# Altium integrated library ZJUDancer_Circuit_V3.6.3.IntLib: 32 symbols
Pins are listed as number, name and electrical type; pins without a type are passive.

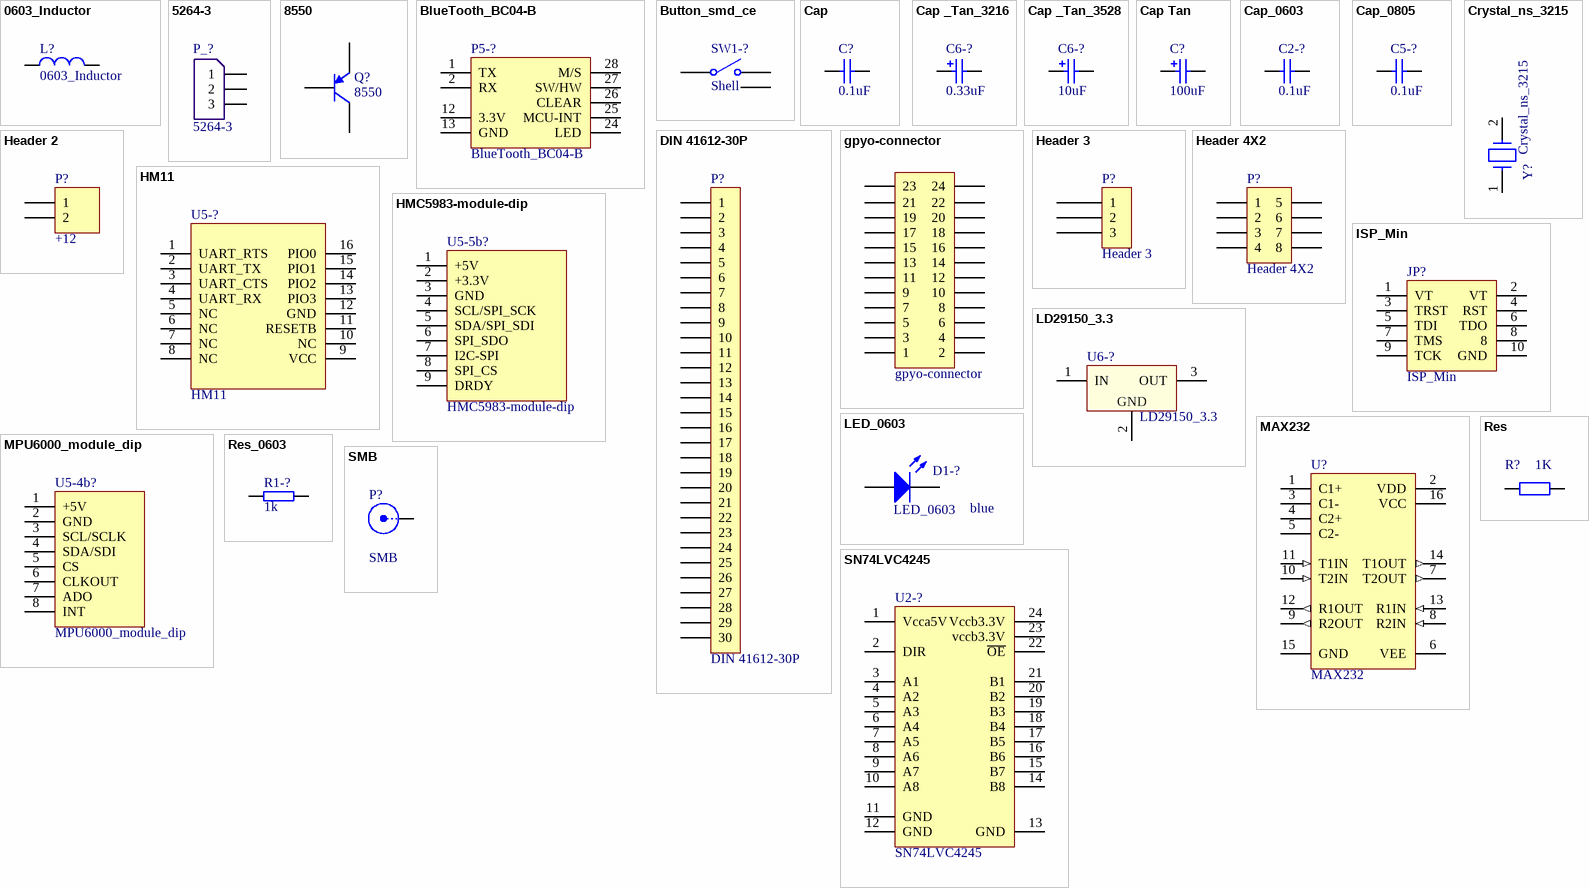
[diagram p0: symbols 0603_Inductor to SN74LVC4245]

## 0603_Inductor
designator L?
电感
footprint 0603_Inductor
pins: 1, 2

## 5264-3
designator P_?
footprint 5264-3 - wan
pins: 1, 2, 3

## 8550
designator Q?
PNP Bipolar Transistor,  SMD; Code - JEDEC: SOT-23; Published: 8-Jun-2000; Revision: July-2002: Re-released for DXP Platform.; Publisher: Altium Limited
footprint 8550_SOT23
pins: 1 B, 2 E, 3 C

## BlueTooth_BC04-B
designator P5-?
蓝牙模块BC04-B; LatestRevisionDate: 17-Jul-2002; LatestRevisionNote: Re-released for DXP Platform.; Publisher: Altium Limited
footprint BlueTooth_BC04-B
pins: 1 TX, 2 RX, 12 3.3V, 13 GND, 24 LED, 25 MCU-INT, 26 CLEAR, 27 SW/HW, 28 M/S

## Button_smd_ce
designator SW1-?  (value not drawn)
Published: 24-Mar-1999; LatestRevisionDate: 17-Jul-2002; LatestRevisionNote: Re-released for DXP Platform.; PackageReference: SPST-2; Publisher: Altium Limited; PackageDescription: Switch; 2 Leads
footprint Button_smd_ce
pins: 0 Shell, 1 COMMON, 2 NO

## Cap
designator C?, comment 0.1uF
Capacitor; Manufacturer: Generic Components; Class: Passive; Published: 08/06/2000; Publisher: Altium Hobart Technology Centre; SubClass: Capacitor; Value: 0.1uF
footprint 0805c
footprint 1206
pins: 1, 2

## Cap _Tan_3216
designator C6-?  value 0.33uF  (hidden comment: Cap _Tan_3216)
Tantalum Capacitor,  SMD; Manufacturer: Generic Components; Class: Passive; Published: 14/01/2012; Publisher: ZJUDancer; SubClass: Capacitor
footprint TCAP_3216A
footprint TCAP_3216A
pins: 1, 2

## Cap _Tan_3528
designator C6-?  value 10uF  (hidden comment: Cap _Tan_3528)
Tantalum Capacitor,  SMD; Manufacturer: Generic Components; Class: Passive; Published: 14/01/2012; Publisher: ZJUDancer; SubClass: Capacitor
footprint TCAP_3528A
footprint TCAP_3528A
pins: 1, 2

## Cap Tan
designator C?, comment 100uF
tantalum capacitor; value: 100uF
footprint TCap_7343D
pins: 1, 2

## Cap_0603
designator C2-?  value 0.1uF  (hidden comment: Cap_0603)
Manufacturer: Generic Components; Class: Passive; SubClass: Capacitor; Published: 08/06/2000; Publisher: Altium Hobart Technology Centre
footprint Cap_0603
footprint 1206
pins: 1, 2

## Cap_0805
designator C5-?  value 0.1uF  (hidden comment: Cap_0805)
Manufacturer: Generic Components; Class: Passive; SubClass: Capacitor; Published: 08/06/2000; Publisher: Altium Hobart Technology Centre
footprint 0805_Cap
footprint 1206
footprint 0805C
footprint Cap_0603
pins: 1, 2

## Crystal_ns_3215
designator Y?
无源晶振
footprint Crystal_ns_3215
pins: 1, 2
2 alternate drawings of the same symbol

## DIN 41612-30P
designator P?
footprint DIN 41612-30P/P
footprint DIN 41612-30P/R
pins: 1, 2, 3, 4, 5, 6, 7, 8, 9, 10, 11, 12, 13, 14, 15, 16, 17, 18, 19, 20, 21, 22, 23, 24, 25, 26, 27, 28, 29, 30

## gpyo-connector
designator ?
footprint gypo-connector
pins: 1, 2, 3, 4, 5, 6, 7, 8, 9, 10, 11, 12, 13, 14, 15, 16, 17, 18, 19, 20, 21, 22, 23, 24

## Header 2
designator P?, comment +12
Header, 2-Pin; Manufacturer: Generic Components; Class: Connector
footprint conector3.96_8L*8W_2*1_yellow
footprint conector3.96_7.92l*11.7w_2*1_white
footprint HEADER2.54_2
pins: 1, 2

## Header 3
designator P?
footprint HEADER2.0_3 (Footprint not found)
pins: 1, 2, 3

## Header 4X2
designator P?
footprint HEADER2.54_4*2
pins: 1, 2, 3, 4, 5, 6, 7, 8

## HM11
designator U5-?
Bluetooth Module; Manufacturer: Generic Components; Class: Active; SubClass: RS-232 Receptor&Deliver; Published: 14/01/2012; Publisher: ZJUDancer
footprint HM11
pins: 1 UART_RTS, 2 UART_TX, 3 UART_CTS, 4 UART_RX, 5 NC, 6 NC, 7 NC, 8 NC, 9 VCC, 10 NC, 11 RESETB, 12 GND, 13 PIO3, 14 PIO2, 15 PIO1, 16 PIO0

## HMC5983-module-dip
designator U5-5b?
LatestRevisionDate: 17-Jul-2002; LatestRevisionNote: Re-released for DXP Platform.; Publisher: Altium Limited
footprint HMC5983-module-dip (Connector; Header; 9 Position)
signal-integrity model Connector
pins: 1 +5V, 2 +3.3V, 3 GND, 4 SCL/SPI_SCK, 5 SDA/SPI_SDI, 6 SPI_SDO, 7 I2C-SPI, 8 SPI_CS, 9 DRDY

## ISP_Min
designator JP?
Header, 5-Pin, Dual row; LatestRevisionDate: 17-Jul-2002; LatestRevisionNote: Re-released for DXP Platform.; Publisher: Altium Limited
footprint ISP_Min
signal-integrity model Connector
pins: 1 VT, 2 VT, 3 TRST, 4 RST, 5 TDI, 6 TDO, 7 TMS, 8, 9 TCK, 10 GND

## LD29150_3.3
designator U6-?
footprint DPAK_LD29150-3.3
pins: 1 IN, 2, 3 OUT
text: GND

## LED_0603
designator D1-?  Color: blue
Published: 8-Jun-2000; LatestRevisionDate: 17-Jul-2002; LatestRevisionNote: Re-released for DXP Platform.; PackageDocument: Feb-2002; PackageReference: 3.2X1.6X1.1; Publisher: Altium Limited
footprint 0603_led
pins: 1 A, 2 K

## MAX232
designator U?
+5V Powered, Multi-Channel RS-232 Driver/Receiver; Manufacturer: Generic Components; Class: Active; SubClass: RS-232 Receptor&Deliver; Published: 14/01/2012; Publisher: ZJUDancer
footprint MAX232_SOIC16
pins: 1 C1+, 2 VDD (power), 3 C1-, 4 C2+, 5 C2-, 6 VEE, 7 T2OUT (out), 8 R2IN (in), 9 R2OUT (out), 10 T2IN (in), 11 T1IN (in), 12 R1OUT (out), 13 R1IN (in), 14 T1OUT (out), 15 GND (power), 16 VCC (power)

## MPU6000_module_dip
designator U5-4b?
LatestRevisionDate: 17-Jul-2002; LatestRevisionNote: Re-released for DXP Platform.; Publisher: Altium Limited
footprint MPU6000_module_dip (Connector; Header; 8 Position)
signal-integrity model Connector
pins: 1 +5V, 2 GND, 3 SCL/SCLK, 4 SDA/SDI, 5 CS, 6 CLKOUT, 7 ADO, 8 INT

## Res
designator R?, comment value 1K  (hidden comment: 4.7k)
Resistor; Published: 8-Jun-2000; LatestRevisionDate: 17-Jul-2002; LatestRevisionNote: Re-released for DXP Platform.; Publisher: Altium Limited
footprint 0805R
footprint 1206
pins: 1, 2

## Res_0603
designator R1-?, comment value 1k  (hidden comment: Res)
Resistor; Published: 8-Jun-2000; LatestRevisionDate: 17-Jul-2002; LatestRevisionNote: Re-released for DXP Platform.; PackageReference: 0805; Publisher: Altium Limited
footprint 0805_Res
simulation model RESISTOR (Resistor)
signal-integrity model Res
footprint 0805R
footprint 0603_Res
pins: 1, 2

## SMB
designator P?
SMB Straight Connector; LatestRevisionDate: 17-Jul-2002; LatestRevisionNote: Re-released for DXP Platform.; Publisher: Altium Limited
footprint 安装孔
signal-integrity model Connector
footprint 小安装孔
pins: 1 X

## SN74LVC4245
designator U2-?
3.3V-5V电平转换
footprint SN74LVC4245_SOP24_Small
pins: 1 Vcca5V, 2 DIR, 3 A1, 4 A2, 5 A3, 6 A4, 7 A5, 8 A6, 9 A7, 10 A8, 11 GND, 12 GND, 13 GND, 14 B8, 15 B7, 16 B6, 17 B5, 18 B4, 19 B3, 20 B2, 21 B1, 22 ~{OE}, 23 vccb3.3V, 24 Vccb3.3V

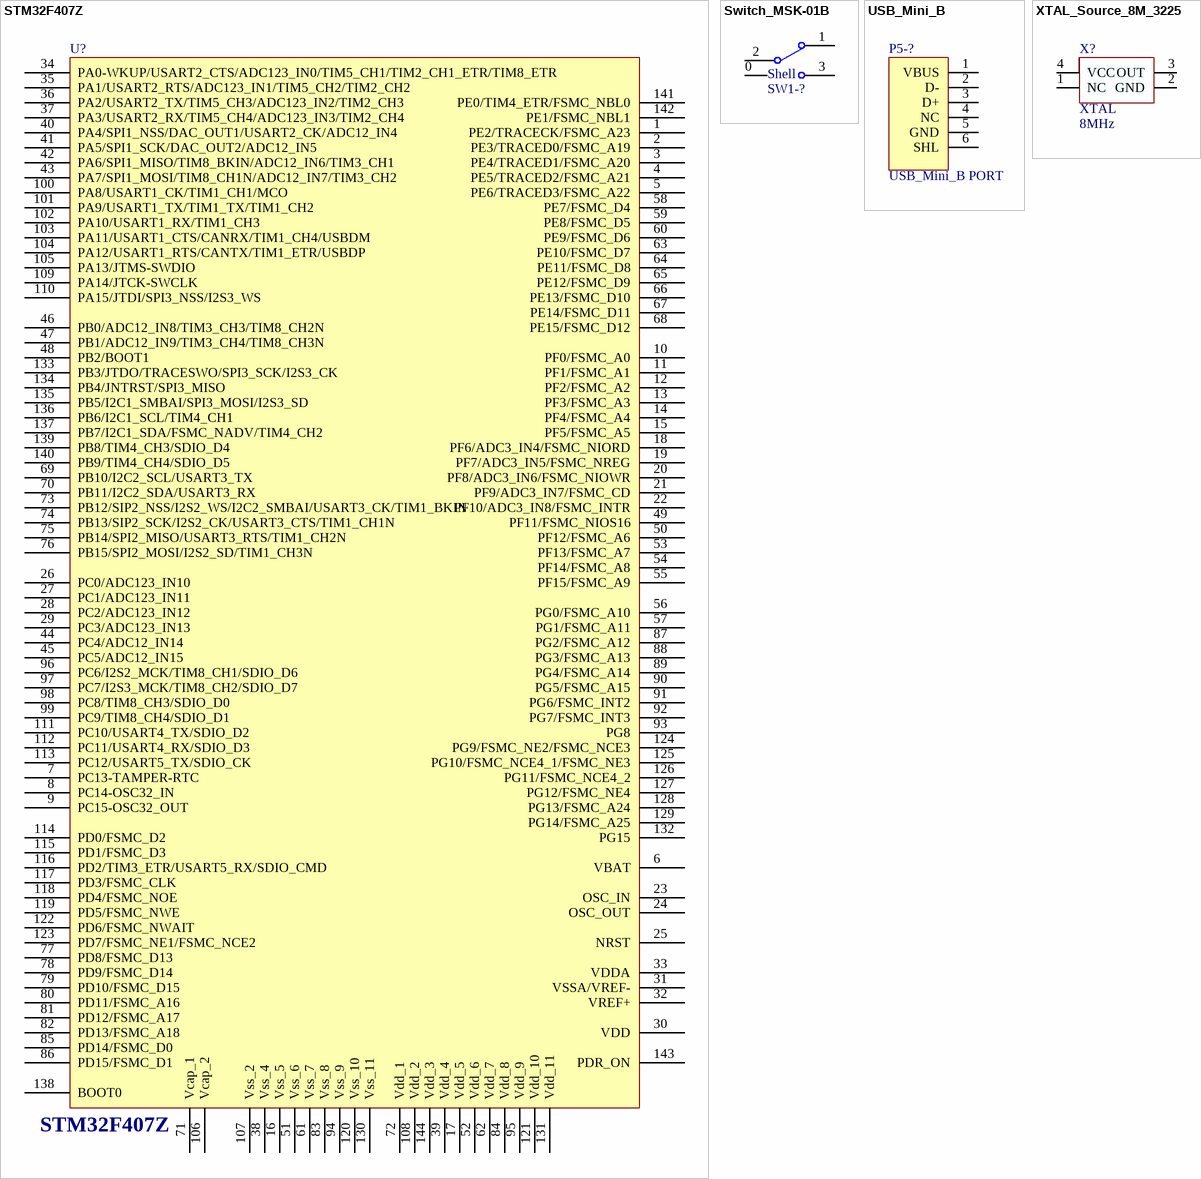
[diagram p1: symbols STM32F407Z to XTAL_Source_8M_3225]

## STM32F407Z
designator U?
ARM-Cortex-M4-Microcontroller
footprint STM32F407_LQFP144
pins: 1 PE2/TRACECK/FSMC_A23, 2 PE3/TRACED0/FSMC_A19, 3 PE4/TRACED1/FSMC_A20, 4 PE5/TRACED2/FSMC_A21, 5 PE6/TRACED3/FSMC_A22, 6 VBAT, 7 PC13-TAMPER-RTC, 8 PC14-OSC32_IN, 9 PC15-OSC32_OUT, 10 PF0/FSMC_A0, 11 PF1/FSMC_A1, 12 PF2/FSMC_A2, 13 PF3/FSMC_A3, 14 PF4/FSMC_A4, 15 PF5/FSMC_A5, 16 Vss_5, 17 Vdd_5, 18 PF6/ADC3_IN4/FSMC_NIORD, 19 PF7/ADC3_IN5/FSMC_NREG, 20 PF8/ADC3_IN6/FSMC_NIOWR, 21 PF9/ADC3_IN7/FSMC_CD, 22 PF10/ADC3_IN8/FSMC_INTR, 23 OSC_IN, 24 OSC_OUT, 25 NRST, 26 PC0/ADC123_IN10, 27 PC1/ADC123_IN11, 28 PC2/ADC123_IN12, 29 PC3/ADC123_IN13, 30 VDD, 31 VSSA/VREF-, 32 VREF+, 33 VDDA, 34 PA0-WKUP/USART2_CTS/ADC123_IN0/TIM5_CH1/TIM2_CH1_ETR/TIM8_ETR, 35 PA1/USART2_RTS/ADC123_IN1/TIM5_CH2/TIM2_CH2, 36 PA2/USART2_TX/TIM5_CH3/ADC123_IN2/TIM2_CH3, 37 PA3/USART2_RX/TIM5_CH4/ADC123_IN3/TIM2_CH4, 38 Vss_4, 39 Vdd_4, 40 PA4/SPI1_NSS/DAC_OUT1/USART2_CK/ADC12_IN4, 41 PA5/SPI1_SCK/DAC_OUT2/ADC12_IN5, 42 PA6/SPI1_MISO/TIM8_BKIN/ADC12_IN6/TIM3_CH1, 43 PA7/SPI1_MOSI/TIM8_CH1N/ADC12_IN7/TIM3_CH2, 44 PC4/ADC12_IN14, 45 PC5/ADC12_IN15, 46 PB0/ADC12_IN8/TIM3_CH3/TIM8_CH2N, 47 PB1/ADC12_IN9/TIM3_CH4/TIM8_CH3N, 48 PB2/BOOT1, 49 PF11/FSMC_NIOS16, 50 PF12/FSMC_A6, 51 Vss_6, 52 Vdd_6, 53 PF13/FSMC_A7, 54 PF14/FSMC_A8, 55 PF15/FSMC_A9, 56 PG0/FSMC_A10, 57 PG1/FSMC_A11, 58 PE7/FSMC_D4, 59 PE8/FSMC_D5, 60 PE9/FSMC_D6, 61 Vss_7, 62 Vdd_7, 63 PE10/FSMC_D7, 64 PE11/FSMC_D8, 65 PE12/FSMC_D9, 66 PE13/FSMC_D10, 67 PE14/FSMC_D11, 68 PE15/FSMC_D12, 69 PB10/I2C2_SCL/USART3_TX, 70 PB11/I2C2_SDA/USART3_RX, 71 Vcap_1, 72 Vdd_1, 73 PB12/SIP2_NSS/I2S2_WS/I2C2_SMBAI/USART3_CK/TIM1_BKIN, 74 PB13/SIP2_SCK/I2S2_CK/USART3_CTS/TIM1_CH1N, 75 PB14/SPI2_MISO/USART3_RTS/TIM1_CH2N, 76 PB15/SPI2_MOSI/I2S2_SD/TIM1_CH3N, 77 PD8/FSMC_D13, 78 PD9/FSMC_D14, 79 PD10/FSMC_D15, 80 PD11/FSMC_A16, 81 PD12/FSMC_A17, 82 PD13/FSMC_A18, 83 Vss_8, 84 Vdd_8, 85 PD14/FSMC_D0, 86 PD15/FSMC_D1, 87 PG2/FSMC_A12, 88 PG3/FSMC_A13, 89 PG4/FSMC_A14, 90 PG5/FSMC_A15, 91 PG6/FSMC_INT2, 92 PG7/FSMC_INT3, 93 PG8, 94 Vss_9, 95 Vdd_9, 96 PC6/I2S2_MCK/TIM8_CH1/SDIO_D6, 97 PC7/I2S3_MCK/TIM8_CH2/SDIO_D7, 98 PC8/TIM8_CH3/SDIO_D0, 99 PC9/TIM8_CH4/SDIO_D1, 100 PA8/USART1_CK/TIM1_CH1/MCO, 101 PA9/USART1_TX/TIM1_TX/TIM1_CH2, 102 PA10/USART1_RX/TIM1_CH3, 103 PA11/USART1_CTS/CANRX/TIM1_CH4/USBDM, 104 PA12/USART1_RTS/CANTX/TIM1_ETR/USBDP, 105 PA13/JTMS-SWDIO, 106 Vcap_2, 107 Vss_2, 108 Vdd_2, 109 PA14/JTCK-SWCLK, 110 PA15/JTDI/SPI3_NSS/I2S3_WS, 111 PC10/USART4_TX/SDIO_D2, 112 PC11/USART4_RX/SDIO_D3, 113 PC12/USART5_TX/SDIO_CK, 114 PD0/FSMC_D2, 115 PD1/FSMC_D3, 116 PD2/TIM3_ETR/USART5_RX/SDIO_CMD, 117 PD3/FSMC_CLK, 118 PD4/FSMC_NOE, 119 PD5/FSMC_NWE, 120 Vss_10, 121 Vdd_10, 122 PD6/FSMC_NWAIT, 123 PD7/FSMC_NE1/FSMC_NCE2, 124 PG9/FSMC_NE2/FSMC_NCE3, 125 PG10/FSMC_NCE4_1/FSMC_NE3, 126 PG11/FSMC_NCE4_2, 127 PG12/FSMC_NE4, 128 PG13/FSMC_A24, 129 PG14/FSMC_A25, 130 Vss_11, 131 Vdd_11, 132 PG15, 133 PB3/JTDO/TRACESWO/SPI3_SCK/I2S3_CK, 134 PB4/JNTRST/SPI3_MISO, 135 PB5/I2C1_SMBAI/SPI3_MOSI/I2S3_SD, 136 PB6/I2C1_SCL/TIM4_CH1, 137 PB7/I2C1_SDA/FSMC_NADV/TIM4_CH2, 138 BOOT0, 139 PB8/TIM4_CH3/SDIO_D4, 140 PB9/TIM4_CH4/SDIO_D5, 141 PE0/TIM4_ETR/FSMC_NBL0, 142 PE1/FSMC_NBL1, 143 PDR_ON, 144 Vdd_3

## Switch_MSK-01B
designator SW1-?  (value not drawn)
footprint Switch_MSK-01B
pins: 0, 1, 2, 3
text: Shell

## USB_Mini_B
designator P5-?, comment USB_Mini_B PORT
footprint USB-MINI-B
pins: 1 VBUS, 2 D-, 3 D+, 4 NC, 5 GND, 6 SHL

## XTAL_Source_8M_3225
designator X?, comment XTAL  value 8MHz
有源晶振8M
footprint XTAL_Source_8M_3225
pins: 1 NC, 2 GND, 3 OUT, 4 VCC